# Altium integrated library EFR_Lib.IntLib: 430 symbols (part 2 of 6) (continued)
## CON-RJ45-TE-6368062-6
designator J?, comment RJ-45 8x Cat 5
Conn RJ-45 F 64 POS 2.03mm Solder RA Thru-Hole 96 Terminal 8 Port Tray Cat 5; Manufacturer: TE Connectivity; Manufacturer P/N: 6368062-6; Type 1: Connector; Type 2: IO Connector; Package: None; ComponentLink1Description: Website; ComponentLink1URL: https://www.te.com/de/product-6368062-6.html; ComponentLink2Description: Datasheet; ComponentLink2URL: https://www.te.com/commerce/DocumentDelivery/DDEController?Action=showdoc&DocId=Customer+Drawing%7F6368062%7FE1%7Fpdf%7FEnglish%7FENG_CD_6368062_E1.pdf%7F6368062-6; ComponentLink3Description: SnapEDA; ComponentLink3URL: https://www.snapeda.com/parts/6368062-6/TE%20Connectivity/view-part/; Width (mm): 59.82; Length (mm): 31.06; Height (mm): 17.28; Pin Number: *; Mounting Technology: THT; Parameter 4: *; Supplier 1: Digikey; Supplier Part Number 1: A144991-ND
footprint CON-TE-6368062-6
part A pins: P1.1, P1.2, P1.3, P1.4, P1.5, P1.6, P1.7, P1.8, P1.A1, P1.A2, P1.C1, P1.C2, S1 SHIELD, S2 SHIELD, S3 SHIELD, S4 SHIELD, S5 SHIELD, S6 SHIELD, S7 SHIELD, S8 SHIELD, S9 SHIELD, S10 SHIELD, S11 SHIELD
part B pins: P2.1, P2.2, P2.3, P2.4, P2.5, P2.6, P2.7, P2.8, P2.A1, P2.A2, P2.C1, P2.C2
part C pins: P3.1, P3.2, P3.3, P3.4, P3.5, P3.6, P3.7, P3.8, P3.A1, P3.A2, P3.C1, P3.C2
part D pins: P4.1, P4.2, P4.3, P4.4, P4.5, P4.6, P4.7, P4.8, P4.A1, P4.A2, P4.C1, P4.C2
part E pins: P5.1, P5.2, P5.3, P5.4, P5.5, P5.6, P5.7, P5.8, P5.A1, P5.A2, P5.C1, P5.C2
part F pins: P6.1, P6.2, P6.3, P6.4, P6.5, P6.6, P6.7, P6.8, P6.A1, P6.A2, P6.C1, P6.C2
part G pins: P7.1, P7.2, P7.3, P7.4, P7.5, P7.6, P7.7, P7.8, P7.A1, P7.A2, P7.C1, P7.C2
part H pins: P8.1, P8.2, P8.3, P8.4, P8.5, P8.6, P8.7, P8.8, P8.A1, P8.A2, P8.C1, P8.C2

## CON-SD-WE-693063010911
designator J?, comment WR-CRD
WR-CRD SD Card Connector Push & Pull with Card Detection; Manufacturer P/N: 693063010911; Manufacturer: Würth Elektronik; Contact Resistance: 100mOhm; Gender: Socket; Rated Current: 0.5A; Working Voltage: 100VAC; Withstanding Voltage: 500VAC; Category: Input/Output Connectors; Match Code: WR-CRD; ComponentLink1Description: Website Link; ComponentLink1URL: https://www.we-online.com/redexpert/article/693063010911?ad; ComponentLink2Description: Datasheet Link; ComponentLink2URL: https://www.we-online.com/redexpert/spec/693063010911?ad; Mounting Technology: SMT; Operating Temperature Max: 85°C; Operating Temperature Min: -25°C; Packaging: Tape and Reel; Number of Pins: 9; Type: Push & Pull
footprint 693063010911
pins: 1 CD/DAT3, 2 CMD, 3 VSS1, 4 VDD, 5 CLK, 6 VSS2, 7 DAT0, 8 DAT1, 9 DAT2, 10 CD, 11 WP, Shell Shield

## CON-SMA-WE-60311002111526
designator J?, comment 60311002111526
WR-SMA PCB Jack, THT, Right Angle; Manufacturer: Würth Elektronik; Impedance: 50Ohm; Connector Type: SMA; Frequency Range: DC~6GHz; Interface: MIL-STD-348; Center Contact Diameter: 1.27mm; ComponentLink1Description: Manufacturer; ComponentLink1URL: http://www.we-online.de; ComponentLink2Description: Datasheet; ComponentLink2URL: https://katalog.we-online.com/em/datasheet/60311002111526.pdf; Manufacturer P/N: 60311002111526; Published Date: May 2019; Operating Temperature: -65 to +165degC; Gender: Jack; Packaging: Tray; Mounting Technology: THT; Orientation Type: Right Angle
footprint CON-SMA-60311002111526 (SMA PCB THT Jack)
pins: 1 Signal (in) "Signal Pin", 2 GND (power), 3 GND (power), 4 GND (power), 5 GND (power)

## CON-USB
designator J?, comment 1734366-1
Recept Assy, Vertical, 4 Position, Thru-Hole, Type A USB, RoHS, Tray; Manufacturer: TE Connectivity; Case\Package: SMA; Peak Reverse Current: 200 uA; Forward Voltage: 500 mV; Max Surge Current: 40 A; Max Operating Temperature: 125 degC; ComponentLink1URL: http://www.te.com/; Mounting Technology: SMT; ComponentLink2URL: http://www.te.com/commerce/DocumentDelivery/DDEController?Action=showdoc&DocId=Customer+Drawing%7F1734366%7FC3%7Fpdf%7FEnglish%7FENG_CD_1734366_C3.pdf%7F1734366-1; ComponentLink2Description: Datasheet; Pins: 2; RoHSCompliant: true; REACH SVHC: No SVHC; Radiation Hardening: No; Min Operating Temperature: -65 degC; Manufacturer P/N: 1734366-1; PackageDescription: 6-Pin Through Hole Device, Length 15 mm, Height 15 mm, Tail Length 2.8 mm; ComponentLink1Description: Manufacturer URL; Package Quantity: 7500; DatasheetVersion: Rev. C3, 03/2016; Packaging: Tape and Reel
footprint CON-USB (Connector, 6-Leads, Body 7.62x15mm)
pins: 1 VBUS, 2 D-, 3 D+, 4 GND, 5 SHLD1, 6 SHLD2

## CON-USB-C-WE-632723300011
designator J?, comment USB C 3.1
WR-COM USB 3.1 Type C Receptacle Horizontal THR / SMT; Manufacturer P/N: 632723300011; Manufacturer: Würth Elektronik; Match Code: WR-USB; Interface Type: Type C; Number of Ports: 1; Rated Current: 5A; Working Voltage: 20V (DC); Category: Input/Output Connectors; ComponentLink1Description: Website Link; ComponentLink1URL: https://www.we-online.com/redexpert/article/632723300011?ad; ComponentLink2Description: Datasheet Link; ComponentLink2URL: https://www.we-online.com/redexpert/spec/632723300011?ad; Mounting Technology: SMT; Operating Temperature Max: 105°C; Operating Temperature Min: -40°C; Packaging: Tape and Reel; Application: USB 3.1; Gender: Receptacle; Number of Pins: 24; Orientation: Horizontal; Supplier 1: Mouser; Supplier Part Number 1: 710-632723300011; Supplier 2: Digi-Key; Supplier Part Number 2: 732-9618-6-ND
footprint CON-USB-C-WE-632723300011 (USB 3.1 Type C Receptacle Horizontal THR)
pins: A1 GND, A2 SSTXp1, A3 SSTXn1, A4 VBUS, A5 CC, A6 Dp1, A7 Dn1, A8 SBU1, A9 VBUS, A10 SSRXn2, A11 SSRXp2, A12 GND, B1 GND, B2 SSTXp2, B3 SSTXn2, B4 VBUS, B5 VCONN, B6 Dp2, B7 Dn2, B8 SBU2, B9 VBUS, B10 SSRXn1, B11 SSRXp1, B12 GND, Shell Shield

## CON-USB-WE-614004190021
designator J?, comment 614004190021
WR-COM USB 2.0 Type A Horizontal THT; Manufacturer: Würth Elektronik; Match Code: WR-USB; Gender: Receptacle; Interface Type: Type A; Number of Ports: 1; Rated Current: 3A; Working Voltage: 30V (AC); Manufacturer P/N: 614004190021; Category: Input/Output Connectors; ComponentLink1Description: Website Link; ComponentLink1URL: https://www.we-online.com/redexpert/article/614004190021?ad; ComponentLink2Description: Datasheet Link; ComponentLink2URL: https://www.we-online.com/redexpert/spec/614004190021?ad; Mounting Technology: THT; Operating Temperature Max: 85°C; Operating Temperature Min: -40°C; Packaging: Tray; Application: USB 2.0; Number of Pins: 4; Orientation: Horizontal
footprint 614004190021
pins: 1 VBUS, 2 D-, 3 D+, 4 GND, Shell Shield

## Messpunkt
designator J?
footprint Messpunkt
pins: 1

## Pad-Connector
designator J?, comment Pad-Connenctor
footprint TSAL-L Connector
footprint ASSI-Connector (1)
pins: 1, 2, 3

## PadCON
designator J?  (value not drawn)  (no BOM)
Pretty Awesome Device for Connection, 10A max; System: Connector; Destination: Destination
footprint PadCON_10*5 (Pretty Awesome Device for Connection)
footprint PadCON_60*10
pins: 1 (power)

## PadCON_M4
designator J?, comment M4 Pad Connector  (value not drawn)  (no BOM)
M4 hole to connect a PCB directly to a Würth Press-Fit Connector, 64A MAX; System: Connector; Destination: Destination
footprint PADCON_M4
pins: 1 (power)

## Testpoint_1
designator T?  (no BOM)
Testpoint
footprint Testpoint_1.5mm (Testpoint mit einem Durchmesser von 1.5mm)
footprint Testpoint_1mm (Testpoint mit einem Durchmesser von 1mm)
pins: 1


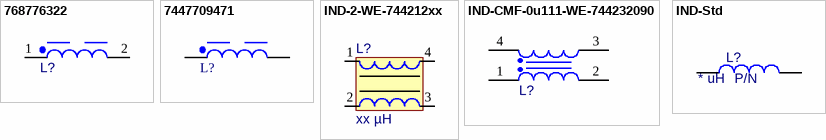
[diagram p8: symbols 768776322 to IND-Std]

## 768776322
designator L?, comment 2200µH, 0.18A  (value not drawn)
WE-PD2 HV SMT High Voltage Power Inductor, size 1054, 2200µH, 0.18A, 5.3Ω; Manufacturer P/N: 768776322; Manufacturer: Wurth Elektronik; Case/Size Code: 1054; DC Resistance: 4.4Ω; Operating Voltage (DC): 400V; Saturation Current: 0.26A; Self Resonant Frequency: 1.3MHz; Category: High Voltage Power Inductors; Match Code: WE-PD2 HV; ComponentLink1Description: Website Link; ComponentLink1URL: https://www.we-online.com/redexpert/article/768776322?ad; ComponentLink2Description: Datasheet Link; ComponentLink2URL: https://www.we-online.com/redexpert/spec/768776322?ad; Mounting Technology: SMT; Operating Temperature Max: 125°C; Operating Temperature Min: -40°C; Packaging: Tape and Reel; Length: 10mm; Width: 9mm; Height: 5.4mm; DC Resistance Max: 5.3Ω; Inductance: 2200µH; Rated Current: 0.18A
simulation model 1054_768776322_2.2m
footprint WE-PD2 HV_1054 (SMT High Voltage Power Inductor, 2-Leads, body 10.00x9.00mm)
pins: 1, 2

## 7447709471
designator L?, comment 470uH, 1.4A  (value not drawn)
WE-PD SMT Power Inductor, size 1210, 470uH, 1.4A, 560mOhm; Manufacturer Part Number: 7447709471; Manufacturer: Wurth Elektronik; Case/Size Code: 1210; DC Resistance: 437mOhm; Saturation Current: 1.5A; Self Resonant Frequency: 1.8MHz; Type: Standard; Category: Power Inductors; Match Code: WE-PD; ComponentLink1Description: Website Link; ComponentLink1URL: https://www.we-online.com/redexpert/article/7447709471?ad; ComponentLink2Description: Datasheet Link; ComponentLink2URL: https://www.we-online.com/redexpert/spec/7447709471?ad; Mount: Surface Mount; Operating Temperature Max: 125°C; Operating Temperature Min: -40°C; Packaging: Tape and Reel; Length: 12mm; Width: 12mm; Height: 10mm; DC Resistance Max: 560mOhm; Inductance: 470uH; Rated Current: 1.4A
footprint WE-PD_1210
simulation model 1210_7447709471_470u
pins: 1, 2

## IND-2-WE-744212xx
designator L?, comment Inductance: xx µH  (hidden comment: 744212xxx)
SMD Common Mode Line Filter WE-SL1, L = xxx µH; Manufacturer: Wurth Elektronik; ComponentLink2Description: Datasheet; PackageReference: WE-SL1; PackageDescription: SMD Inductor, 4-Leads, Body 3.8 x 6.5 mm; ComponentLink2URL: http://www.we-online.de/katalog/media/pdf/744212101.pdf; ComponentLink1Description: Manufacturer Link; ComponentLink1URL: http://www.we-online.com; PartNumber: 744212xxx
footprint WE-SL1 (SMD Inductor, 4-Leads, Body 3.8 x 6.5 mm)
pins: 1, 2, 3, 4

## IND-CMF-0u111-WE-744232090
designator L?, comment 90Ohm  (value not drawn)
WE-CNSW SMT Common Mode Line Filter, size 1206, 90Ohm, 0.111uH, 50V; Manufacturer: Wurth Elektronik; PartNumber: 744232090; Case/Size Code: 1206; DC Resistance Max: 0.3Ohm; Insulation Test Voltage: 125VAC; Rated Current: 0.37A; Winding Style: bifiliar; ComponentLink1Description: Manufacturer Link; ComponentLink1URL: https://www.we-online.com/redexpert/article/744232090?ad; ComponentLink2Description: Datasheet; ComponentLink2URL: https://www.we-online.com/redexpert/spec/744232090?ad; Category: Common Mode Chokes; Match Code: WE-CNSW; Mount: Surface Mount; Operating Temperature Max: 125°C; Operating Temperature Min: -40°C; Packaging: Tape and Reel; Length: 3.2mm; Width: 1.6mm; Height: 1.8mm; Impedance @100MHz: 90Ohm; Inductance: 0.111uH; Rated Voltage: 50V
footprint WE-CNSW_1206
pins: 1, 2, 3, 4

## IND-Std
designator L?, comment PartNumber: P/N  Inductance: * uH  (hidden comment: Inductor)
ComponentLink1Description: Manufacturer; ComponentLink1URL: http://www.we-online.de; ComponentLink2Description: Datasheet; ComponentLink2URL: https://katalog.we-online.de/pbs/datasheet/744032100.pdf; DC Resistance max.: *; Operating Temperature: *; Package: *; Manufacturer: *
footprint WE-LQ_1210
footprint WE-LQ_1812 (SMT Inductor, body 4.5x3.2mm)
footprint 2512(6432)_N (Chip Resistor, Body 6.4x3.2mm, IPC Medium Density)
footprint 2512(6432)_M (Chip Resistor, Body 6.4x3.2mm, IPC Low Density)
footprint 2512(6432)_L (Chip Resistor, Body 6.4x3.2mm, IPC High Density)
pins: 1, 2


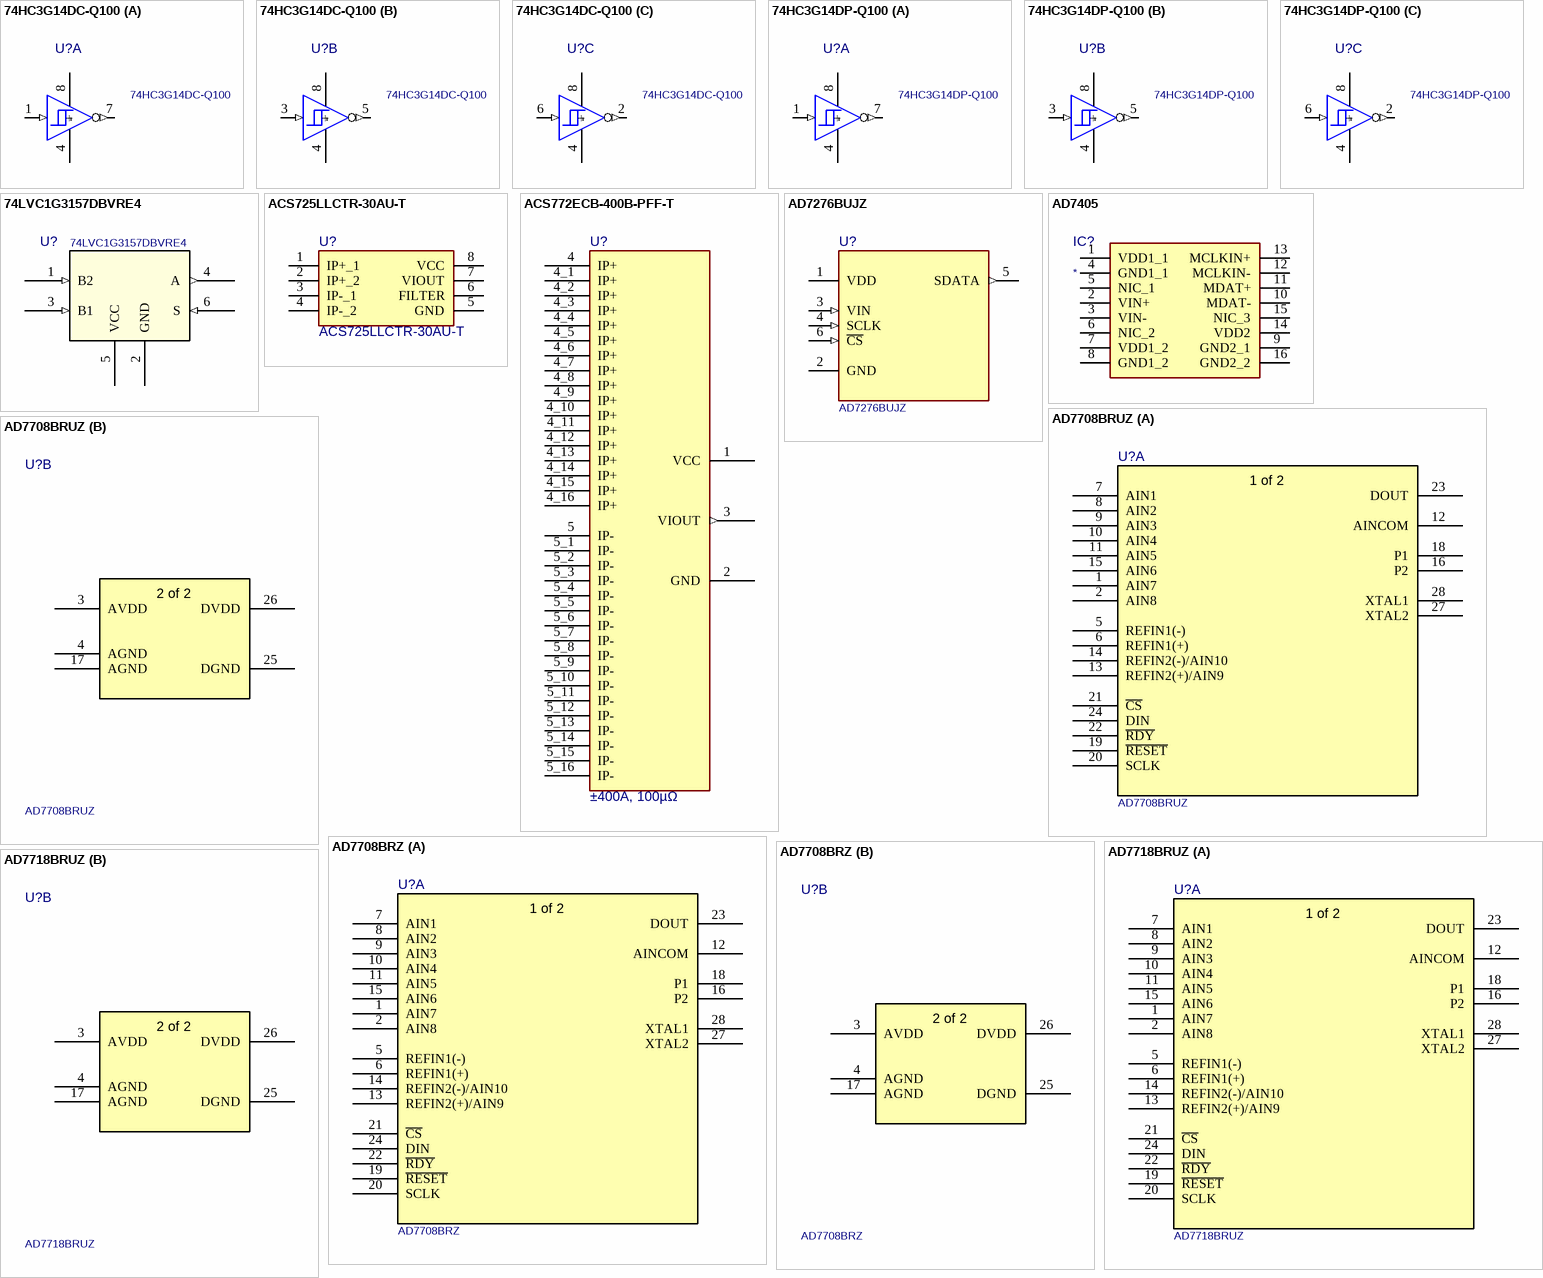
[diagram p9: symbols 74HC3G14DC-Q100 to AD7718BRUZ]

## 74HC3G14DC-Q100
designator U?
Manufacturer: Nexperia; ComponentLink1Description: Datasheet; ComponentLink1URL: https://assets.nexperia.com/documents/data-sheet/74HC_HCT3G14_Q100.pdf; ComponentLink2Description: Manufacturer; ComponentLink2URL: https://www.nexperia.com/products/automotive-qualified-products-aec-q100-q101/automotive-logic/buffers-drivers-transceivers/74HC3G14DC-Q100.html; Manufacturer P/N: 74HC3G14DC-Q100; Supplier 1: Mouser; Supplier 2: Digi-Key; Supplier Part Number 1: 771-74HC3G14DCQ100H; Supplier Part Number 2: 74HC3G14DC-Q100H-ND; Mounting Technology: SMT
footprint VSSOP-8_N
part A pins: 1 1A (in) "Input 1A", 4 - "GND", 7 ~{1Y} (out) "Output 1Y", 8 + "VCC"
part B pins: 3 2A (in) "Input 1A", 4 - "GND", 5 ~{2Y} (out) "Output 1Y", 8 + "VCC"
part C pins: 2 ~{3Y} (out) "Output 1Y", 4 - "GND", 6 3A (in) "Input 1A", 8 + "VCC"

## 74HC3G14DP-Q100
designator U?
Manufacturer: Nexperia; Supplier 1: Mouser; Supplier Part Number 1: 771-74HC3G14DPQ100H; ComponentLink1Description: Datasheet; ComponentLink1URL: https://assets.nexperia.com/documents/data-sheet/74HC_HCT3G14_Q100.pdf; ComponentLink2Description: Manufacturer; ComponentLink2URL: https://www.nexperia.com/products/automotive-qualified-products-aec-q100-q101/automotive-logic/buffers-drivers-transceivers/74HC3G14DP-Q100.html; Manufacturer P/N: 74HC3G14DP-Q100; Mounting Technology: SMT
footprint TSSOP-8_N
part A pins: 1 1A (in) "Input 1A", 4 - "GND", 7 ~{1Y} (out) "Output 1Y", 8 + "VCC"
part B pins: 3 2A (in) "Input 1A", 4 - "GND", 5 ~{2Y} (out) "Output 1Y", 8 + "VCC"
part C pins: 2 ~{3Y} (out) "Output 1Y", 4 - "GND", 6 3A (in) "Input 1A", 8 + "VCC"

## 74LVC1G3157DBVRE4
designator U?
Single-Pole, Double-Throw Analog Switch; Manufacturer: Texas Instruments; GENERIC_PART_NUMBER: SN74LVC1G3157; INDUSTRY_STD_PKG_TYPE: SOT-23; FAMILY_NAME: ANALOG SWITCH/MULTIPLEXER(less than or equal to 5V); Pin Number: 6; PACKAGE_DESIGNATOR: DBV; Manufacturer P/N: 74LVC1G3157DBVRE4; Mounting Technology: SMT; ComponentLink1Description: Manufacturer; ComponentLink1URL: https://www.ti.com/product/SN74LVC1G3157; ComponentLink2Description: Datasheet; ComponentLink2URL: http://www.ti.com/lit/gpn/SN74LVC1G3157
footprint SOT23-6_N
footprint SOT23-6_M
footprint SOT23-6_L
pins: 1 B2 (in), 2 GND (power), 3 B1 (in), 4 A (out), 5 VCC (power), 6 S (in)

## ACS725LLCTR-30AU-T
designator U?
Automotive-Grade, Galvanically Isolated Current Sensor IC with Common-Mode Field Rejection; Manufacturer: Allegro Microsystems; Voltage (V): 3.3; Current (A): 30; Height: 1.75mm; ComponentLink1Description: Datasheet; ComponentLink1URL: https://drive.google.com/file/d/1XpeKl1Jg8fjBcU44cgJn_I6yO4WueG6L/view?usp=sharing; Mounting Technology: SMT; Manufacturer P/N: ACS725LLCTR-30AU-T
footprint SOIC-8_N (R_8_ADI)
pins: 1 IP+_1, 2 IP+_2, 3 IP-_1, 4 IP-_2, 5 GND, 6 FILTER, 7 VIOUT, 8 VCC (power)

## ACS772ECB-400B-PFF-T
designator U?, comment ±400A, 100µΩ
Current Sensor 400A 1 Channel Hall Effect Bidirectional 5-CB Formed Leads, PFF; Manufacturer P/N: ACS772ECB-400B-PFF-T; Manufacturer: Allegro MicroSystems; Pin Number: 5; Lenght (mm): 13; Op. Temperature Max (°C): 85; Op. Temperature Min (°C): -40; Package: CB-5-PFF; ComponentLink1Description: Website; ComponentLink1URL: https://www.allegromicro.com/en/products/sense/current-sensor-ics/fifty-to-two-hundred-amp-integrated-conductor-sensor-ics/acs772; ComponentLink2Description: Datasheet; ComponentLink2URL: https://www.allegromicro.com/~/media/files/datasheets/acs772-datasheet.pdf; ComponentLink3Description: SnapEDA; ComponentLink3URL: https://www.snapeda.com/parts/ACS772LCB-100U-PFF-T/Allegro MicroSystems LLC/view-part/; Supplier 1: Mouser; Supplier Part Number 1: 250-772ECB400BPFFT; Supplier 2: Digikey; Supplier Part Number 2: 620-ACS772ECB-400B-PFF-T-ND; Mounting Technology: THT; Height (mm): 7; Width (mm): 10
footprint CB-5-PFF (Package CB, 5-Pin, Leadform PFF, Allegro MicroSystems)
pins: 1 VCC (power), 2 GND (power), 3 VIOUT (out), 4 IP+, 4_1 IP+, 4_2 IP+, 4_3 IP+, 4_4 IP+, 4_5 IP+, 4_6 IP+, 4_7 IP+, 4_8 IP+, 4_9 IP+, 4_10 IP+, 4_11 IP+, 4_12 IP+, 4_13 IP+, 4_14 IP+, 4_15 IP+, 4_16 IP+, 5 IP-, 5_1 IP-, 5_2 IP-, 5_3 IP-, 5_4 IP-, 5_5 IP-, 5_6 IP-, 5_7 IP-, 5_8 IP-, 5_9 IP-, 5_10 IP-, 5_11 IP-, 5_12 IP-, 5_13 IP-, 5_14 IP-, 5_15 IP-, 5_16 IP-

## AD7276BUJZ
designator U?
12 Bit Analog to Digital Converter 1 Input 1 SAR TSOT-23-6; Manufacturer: Analog Devices; Pin Count: 6; Package: TSOT-6; Mounting Technology: THT; Manufacturer: AD7276BUJZ; ComponentLink1Description: Website; ComponentLink1URL: https://www.analog.com/en/products/ad7276.html; ComponentLink2Description: Datasheet; ComponentLink2URL: https://www.analog.com/media/en/technical-documentation/data-sheets/ad7276_7277_7278.pdf; ComponentLink3Description: SnapEDA; ComponentLink3URL: https://www.snapeda.com/parts/AD7276AUJZ-REEL7/Analog+Devices/view-part/?ref=snap; Supplier 1: Mouser; Supplier Part Number 1: 584-AD7276BUJZ-500R7; Supplier 2: Mouser; Supplier Part Number 2: 584-AD7276BUJZ-R7; Supplier 3: Farnell; Supplier Part Number 3: 4016459RL
footprint TSOT-6 (Thin Small Outline Transistor / Package (TSOT) 6 Lead)
pins: 1 VDD (power), 2 GND, 3 VIN (in), 4 SCLK (in), 5 SDATA (out), 6 ~{CS} (in)

## AD7405
designator IC?
a high performance, second-order, Σ-Δ modulator / that converts an analog input signal into a high speed, single-bit / LVDS data stream, with on-chip digital isolation based on / Analog Devices, Inc., iCoupler® technology; Manufacturer P/N: AD7405; Height (mm): 2.64; Manufacturer: Analog Devices; Mounting Technology: SMT
footprint SOIC127P1031X264-16N
pins: 1 VDD1_1, 2 VIN+, 3 VIN-, 4 GND1_1, 5 NIC_1, 6 NIC_2, 7 VDD1_2, 8 GND1_2, 9 GND2_1, 10 MDAT-, 11 MDAT+, 12 MCLKIN-, 13 MCLKIN+, 14 VDD2, 15 NIC_3, 16 GND2_2

## AD7708BRUZ
designator U?
ADC 16-Bit 8/10-Channel, Low Voltage, Low Power, Sigma Delta ADC; Manufacturer: Analog Devices Inc; Resolution: 16; Manufacturer P/N: AD7708BRUZ; Type: ADC; ComponentLink1Description: Manufacturer; ComponentLink1URL: https://www.analog.com/en/products/ad7708.html; ComponentLink2Description: Datasheet; ComponentLink2URL: https://www.analog.com/media/en/technical-documentation/data-sheets/AD7708_7718.pdf; Package: TSSOP-28; Supplier 1: Mouser; Supplier Part Number 1: 584-AD7708BRUZ; Supplier 2: Digi-Key; Supplier Part Number 2: AD7708BRUZ-ND; Supplier 3: Farnell; Supplier Part Number 3: 4016681; Mounting Technology: SMT
footprint TSSOP-28_L
footprint TSSOP-28_N
footprint TSSOP-28_M
part A pins: 1 AIN7, 2 AIN8, 5 REFIN1(-), 6 REFIN1(+), 7 AIN1, 8 AIN2, 9 AIN3, 10 AIN4, 11 AIN5, 12 AINCOM, 13 REFIN2(+)/AIN9, 14 REFIN2(-)/AIN10, 15 AIN6, 16 P2, 18 P1, 19 ~{RESET}, 20 SCLK, 21 ~{CS}, 22 ~{RDY}, 23 DOUT, 24 DIN, 27 XTAL2, 28 XTAL1
part B pins: 3 AVDD (power), 4 AGND, 17 AGND, 25 DGND, 26 DVDD (power)
part A text: 1 of 2
part B text: 2 of 2

## AD7708BRZ
designator U?
ADC 16-Bit 8/10-Channel, Low Voltage, Low Power, Sigma Delta ADC; Manufacturer: Analog Devices Inc; Resolution: 16; Manufacturer P/N: AD7708BRZ; Type: ADC; ComponentLink1Description: Manufacturer; ComponentLink1URL: https://www.analog.com/en/products/ad7708.html; ComponentLink2Description: Datasheet; ComponentLink2URL: https://www.analog.com/media/en/technical-documentation/data-sheets/AD7708_7718.pdf; Package: SOIC-28; Supplier 1: Mouser; Supplier Part Number 1: 584-AD7708BRZ; Supplier 2: Digi-Key; Supplier Part Number 2: AD7708BRZ-ND; Supplier 3: Farnell; Supplier Part Number 3: 4016685; Mounting Technology: SMT
footprint SOIC-28_L
footprint SOIC-28_N
footprint SOIC-28_M
part A pins: 1 AIN7, 2 AIN8, 5 REFIN1(-), 6 REFIN1(+), 7 AIN1, 8 AIN2, 9 AIN3, 10 AIN4, 11 AIN5, 12 AINCOM, 13 REFIN2(+)/AIN9, 14 REFIN2(-)/AIN10, 15 AIN6, 16 P2, 18 P1, 19 ~{RESET}, 20 SCLK, 21 ~{CS}, 22 ~{RDY}, 23 DOUT, 24 DIN, 27 XTAL2, 28 XTAL1
part B pins: 3 AVDD (power), 4 AGND, 17 AGND, 25 DGND, 26 DVDD (power)
part A text: 1 of 2
part B text: 2 of 2

## AD7718BRUZ
designator U?
ADC 24-Bit 8/10-Channel, Low Voltage, Low Power, Sigma Delta ADC; Manufacturer: Analog Devices Inc; Resolution: 24; Manufacturer P/N: AD7718BRUZ; Type: ADC; ComponentLink1Description: Manufacturer; ComponentLink1URL: https://www.analog.com/en/products/ad7708.html; ComponentLink2Description: Datasheet; ComponentLink2URL: https://www.analog.com/media/en/technical-documentation/data-sheets/AD7708_7718.pdf; Package: TSSOP-28; Supplier 1: Mouser; Supplier Part Number 1: 584-AD7718BRUZ; Supplier 2: Digi-Key; Supplier Part Number 2: AD7718BRUZ-ND; Supplier 3: Farnell; Supplier Part Number 3: 4016711; Mounting Technology: SMT
footprint TSSOP-28_L
footprint TSSOP-28_N
footprint TSSOP-28_M
part A pins: 1 AIN7, 2 AIN8, 5 REFIN1(-), 6 REFIN1(+), 7 AIN1, 8 AIN2, 9 AIN3, 10 AIN4, 11 AIN5, 12 AINCOM, 13 REFIN2(+)/AIN9, 14 REFIN2(-)/AIN10, 15 AIN6, 16 P2, 18 P1, 19 ~{RESET}, 20 SCLK, 21 ~{CS}, 22 ~{RDY}, 23 DOUT, 24 DIN, 27 XTAL2, 28 XTAL1
part B pins: 3 AVDD (power), 4 AGND, 17 AGND, 25 DGND, 26 DVDD (power)
